# Altium footprint library KNR_Kurs.PcbLib: 250 footprints (part 8 of 16)
Each footprint in its own frame and in the unit in brackets; x right, y up, seen from the top. Pads: shape width x height; smd on the part's side, far side on the other; paste and mask are expansions set on the pad; w line width, h text height; cw(c..) or ccw(c..) is an arc to the next point about the centre after c.
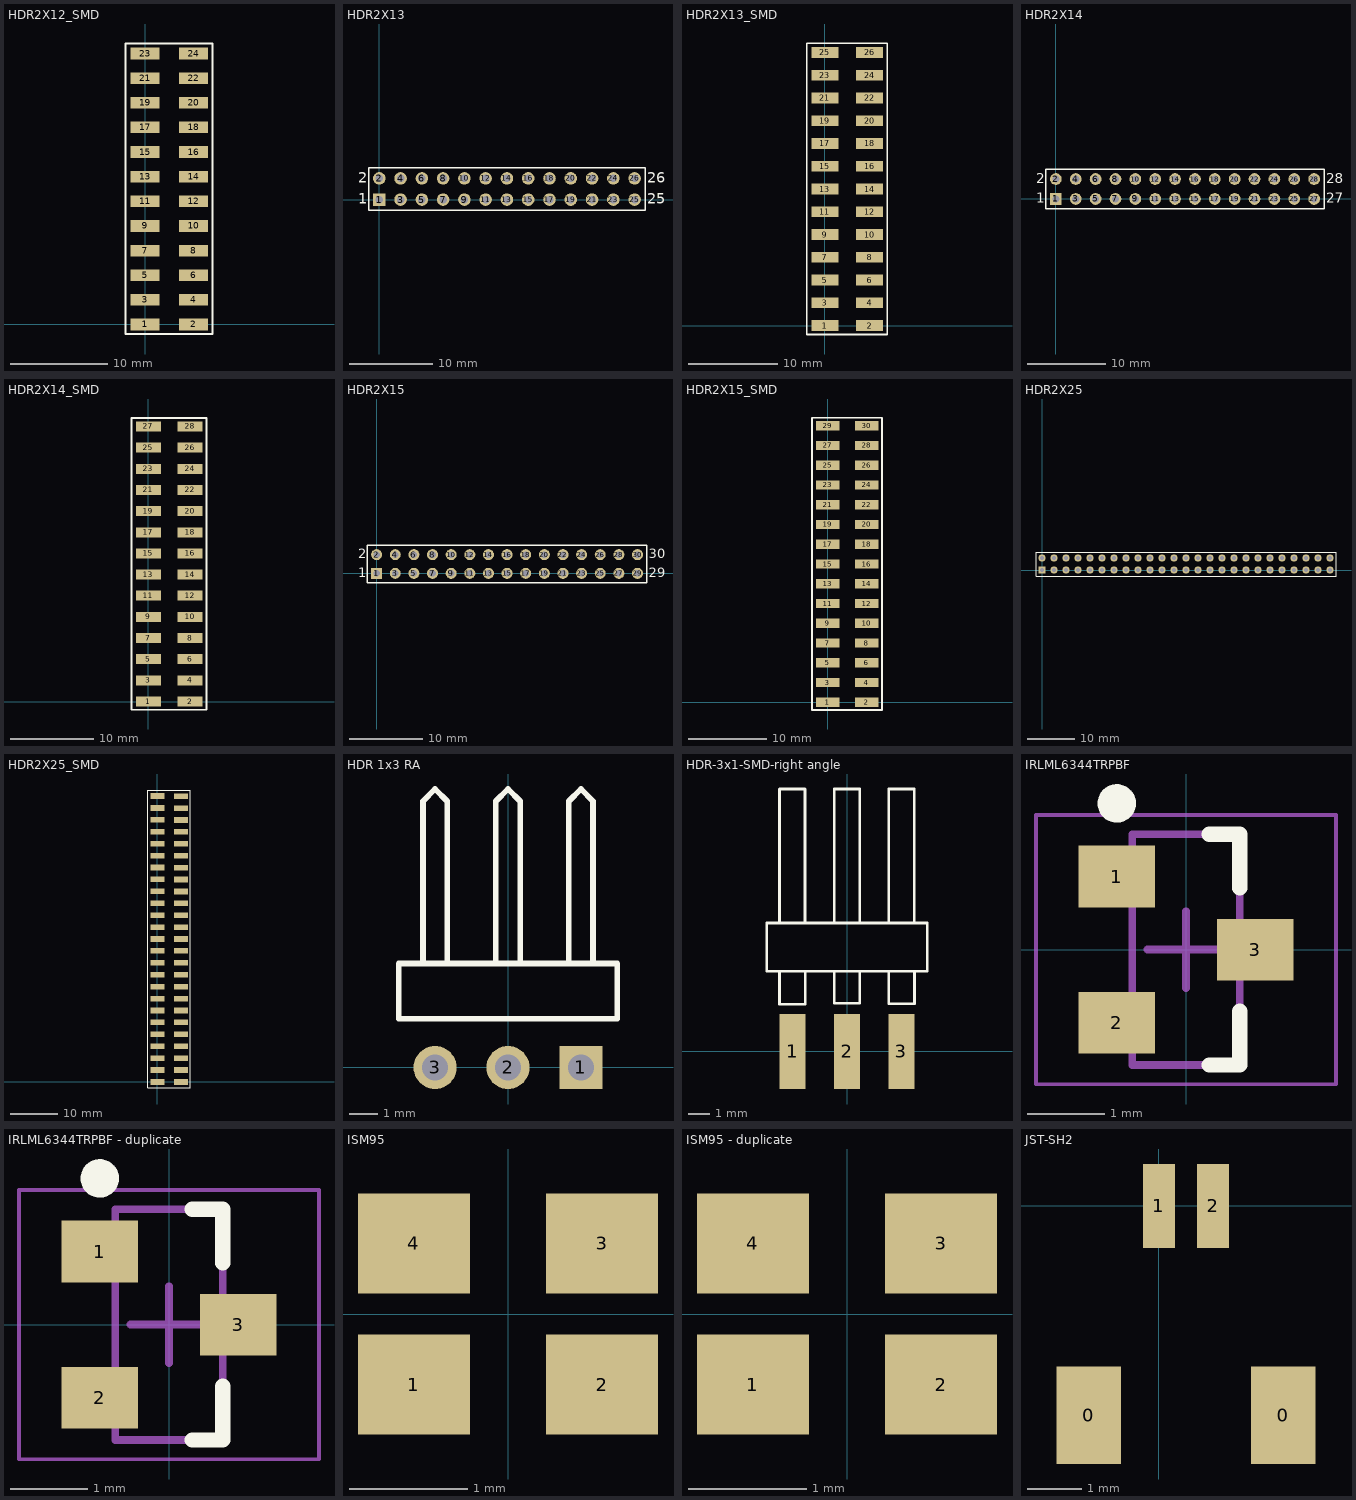
[diagram p7: the footprints below, top view; thin cyan lines are the x and y axes]

## HDR2X12_SMD [mm]
pads (24):
  rect 3x1.2 smd: 1(0,0) 2(5,0) 3(0,2.54) 4(5,2.54) 5(0,5.08) 6(5,5.08) 7(0,7.62) 8(5,7.62) 9(0,10.16) 10(5,10.16) 11(0,12.7) 12(5,12.7) 13(0,15.24) 14(5,15.24) 15(0,17.78) 16(5,17.78) 17(0,20.32) 18(5,20.32) 19(0,22.86) 20(5,22.86) 21(0,25.4) 22(5,25.4) 23(0,27.94) 24(5,27.94)
Top Overlay:
  lines w0.2: -2.032,-0.984 -2.032,28.956 6.968,28.956 6.968,-0.984 -2.032,-0.984
3D body "HDR2X12_SMD.stp": height 9.3, standoff 0, extent -1.15,-1.27 6.15,29.21

## HDR2X13 [mm] "Connector; Header; 13x2 Position"
pads (26):
  rect 1.5x1.5 hole 0.9: 1(0,0)
  round 1.5 hole 0.9: 2(0,2.54) 3(2.54,0) 4(2.54,2.54) 5(5.08,0) 6(5.08,2.54) 7(7.62,0) 8(7.62,2.54) 9(10.16,0) 10(10.16,2.54) 11(12.7,0) 12(12.7,2.54) 13(15.24,0) 14(15.24,2.54) 15(17.78,0) 16(17.78,2.54) 17(20.32,0) 18(20.32,2.54) 19(22.86,0) 20(22.86,2.54) 21(25.4,0) 22(25.4,2.54) 23(27.94,0) 24(27.94,2.54) 25(30.48,0) 26(30.48,2.54)
Top Overlay:
  lines w0.2: -1.27,-1.27 31.75,-1.27 31.75,3.81 -1.27,3.81 -1.27,-1.27
  text "26" at 32.004,2.032 h1.27
  text "25" at 32.004,-0.508 h1.27
  text "1" at -2.54,-0.508 h1.27
  text "2" at -2.54,2.032 h1.27
3D body "HDR2X13.stp": height 8.54, standoff -3, extent -1.27,-1.245 31.75,3.835

## HDR2X13_SMD [mm]
pads (26):
  rect 3x1.2 smd: 1(0,0) 2(5,0) 3(0,2.54) 4(5,2.54) 5(0,5.08) 6(5,5.08) 7(0,7.62) 8(5,7.62) 9(0,10.16) 10(5,10.16) 11(0,12.7) 12(5,12.7) 13(0,15.24) 14(5,15.24) 15(0,17.78) 16(5,17.78) 17(0,20.32) 18(5,20.32) 19(0,22.86) 20(5,22.86) 21(0,25.4) 22(5,25.4) 23(0,27.94) 24(5,27.94) 25(0,30.48) 26(5,30.48)
Top Overlay:
  lines w0.2: -2.032,-0.984 -2.032,31.496 6.968,31.496 6.968,-0.984 -2.032,-0.984
3D body "HDR2X13_SMD.stp": height 9.3, standoff 0, extent -1.15,-1.27 6.15,31.75

## HDR2X14 [mm] "Connector; Header; 14x2 Position"
pads (28):
  rect 1.5x1.5 hole 0.9: 1(0,0)
  round 1.5 hole 0.9: 2(0,2.54) 3(2.54,0) 4(2.54,2.54) 5(5.08,0) 6(5.08,2.54) 7(7.62,0) 8(7.62,2.54) 9(10.16,0) 10(10.16,2.54) 11(12.7,0) 12(12.7,2.54) 13(15.24,0) 14(15.24,2.54) 15(17.78,0) 16(17.78,2.54) 17(20.32,0) 18(20.32,2.54) 19(22.86,0) 20(22.86,2.54) 21(25.4,0) 22(25.4,2.54) 23(27.94,0) 24(27.94,2.54) 25(30.48,0) 26(30.48,2.54) 27(33.02,0) 28(33.02,2.54)
Top Overlay:
  lines w0.2: -1.27,-1.27 34.29,-1.27 34.29,3.81 -1.27,3.81 -1.27,-1.27
  text "28" at 34.544,2.032 h1.27
  text "27" at 34.544,-0.508 h1.27
  text "1" at -2.54,-0.508 h1.27
  text "2" at -2.54,2.032 h1.27
3D body "HDR2X14.stp": height 8.54, standoff -3, extent -1.27,-1.245 34.29,3.835

## HDR2X14_SMD [mm]
pads (28):
  rect 3x1.2 smd: 1(0,0) 2(5,0) 3(0,2.54) 4(5,2.54) 5(0,5.08) 6(5,5.08) 7(0,7.62) 8(5,7.62) 9(0,10.16) 10(5,10.16) 11(0,12.7) 12(5,12.7) 13(0,15.24) 14(5,15.24) 15(0,17.78) 16(5,17.78) 17(0,20.32) 18(5,20.32) 19(0,22.86) 20(5,22.86) 21(0,25.4) 22(5,25.4) 23(0,27.94) 24(5,27.94) 25(0,30.48) 26(5,30.48) 27(0,33.02) 28(5.004,33.02)
Top Overlay:
  lines w0.2: -2.032,-0.984 6.968,-0.984 6.968,34.036 -2.032,34.036 -2.032,-0.984
3D body "HDR2X14_SMD.stp": height 9.3, standoff 0, extent -1.15,-1.27 6.15,34.29

## HDR2X15 [mm] "Connector; Header; 15x2 Position"
pads (30):
  rect 1.5x1.5 hole 0.9: 1(0,0)
  round 1.5 hole 0.9: 2(0,2.54) 3(2.54,0) 4(2.54,2.54) 5(5.08,0) 6(5.08,2.54) 7(7.62,0) 8(7.62,2.54) 9(10.16,0) 10(10.16,2.54) 11(12.7,0) 12(12.7,2.54) 13(15.24,0) 14(15.24,2.54) 15(17.78,0) 16(17.78,2.54) 17(20.32,0) 18(20.32,2.54) 19(22.86,0) 20(22.86,2.54) 21(25.4,0) 22(25.4,2.54) 23(27.94,0) 24(27.94,2.54) 25(30.48,0) 26(30.48,2.54) 27(33.02,0) 28(33.02,2.54) 29(35.56,0) 30(35.56,2.54)
Top Overlay:
  lines w0.2: -1.27,-1.27 -1.27,3.81 36.83,3.81 36.83,-1.27 -1.27,-1.27
  text "30" at 37.084,2.032 h1.27
  text "29" at 37.084,-0.508 h1.27
  text "2" at -2.54,2.032 h1.27
  text "1" at -2.54,-0.508 h1.27
3D body "HDR2X15.stp": height 8.54, standoff -3, extent -1.295,-1.245 36.805,3.835

## HDR2X15_SMD [mm]
pads (30):
  rect 3x1.2 smd: 1(0,0) 2(5,0) 3(0,2.54) 4(5,2.54) 5(0,5.08) 6(5,5.08) 7(0,7.62) 8(5,7.62) 9(0,10.16) 10(5,10.16) 11(0,12.7) 12(5,12.7) 13(0,15.24) 14(5,15.24) 15(0,17.78) 16(5,17.78) 17(0,20.32) 18(5,20.32) 19(0,22.86) 20(5,22.86) 21(0,25.4) 22(5,25.4) 23(0,27.94) 24(5,27.94) 25(0,30.48) 26(5,30.48) 27(0,33.02) 28(5.004,33.02) 29(0,35.56) 30(5.004,35.535)
Top Overlay:
  lines w0.2: -2.032,-0.984 6.968,-0.984 6.968,36.576 -2.032,36.576 -2.032,-0.984
3D body "HDR2X15_SMD.stp": height 9.3, standoff 0, extent -1.15,-1.27 6.15,36.83

## HDR2X25 [mm] "Connector; Header; 25x2 Position"
pads (50):
  rect 1.5x1.5 hole 0.9: 1(0,0)
  round 1.5 hole 0.9: 2(0,2.54) 3(2.54,0) 4(2.54,2.54) 5(5.08,0) 6(5.08,2.54) 7(7.62,0) 8(7.62,2.54) 9(10.16,0) 10(10.16,2.54) 11(12.7,0) 12(12.7,2.54) 13(15.24,0) 14(15.24,2.54) 15(17.78,0) 16(17.78,2.54) 17(20.32,0) 18(20.32,2.54) 19(22.86,0) 20(22.86,2.54) 21(25.4,0) 22(25.4,2.54) 23(27.94,0) 24(27.94,2.54) 25(30.48,0) 26(30.48,2.54) 27(33.02,0) 28(33.02,2.54) 29(35.56,0) 30(35.56,2.54) 31(38.1,0) 32(38.1,2.54) 33(40.64,0) 34(40.64,2.54) 35(43.18,0) 36(43.18,2.54) 37(45.72,0) 38(45.72,2.54) 39(48.26,0) 40(48.26,2.54) 41(50.8,0) 42(50.8,2.54) 43(53.34,0) 44(53.34,2.54) 45(55.88,0) 46(55.88,2.54) 47(58.42,0) 48(58.42,2.54) 49(60.96,0) 50(60.96,2.54)
Top Overlay:
  lines w0.2: -1.27,-1.27 -1.27,3.81 62.23,3.81 62.23,-1.27 -1.27,-1.27
3D body "HDR2X25.stp": height 8.04, standoff -3.46, extent -1.27,-1.27 62.23,3.81

## HDR2X25_SMD [mm]
pads (50):
  rect 3x1.2 smd: 1(0,0) 2(5,0) 3(0,2.54) 4(5,2.54) 5(0,5.08) 6(5,5.08) 7(0,7.62) 8(5,7.62) 9(0,10.16) 10(5,10.16) 11(0,12.7) 12(5,12.7) 13(0,15.24) 14(5,15.24) 15(0,17.78) 16(5,17.78) 17(0,20.32) 18(5,20.32) 19(0,22.86) 20(5,22.86) 21(0,25.4) 22(5,25.4) 23(0,27.94) 24(5,27.94) 25(0,30.48) 26(5,30.48) 27(0,33.02) 28(5.004,33.02) 29(0,35.56) 30(5.004,35.535) 31(0,38.1) 32(5.004,38.075) 33(0,40.64) 34(5.004,40.615) 35(0,43.18) 36(5.004,43.155) 37(0,45.72) 38(5.004,45.695) 39(0,48.26) 40(5.004,48.235) 41(0,50.8) 42(5.004,50.775) 43(0,53.34) 44(5.004,53.315) 45(0,55.88) 46(5.004,55.855) 47(0,58.42) 48(5.004,58.395) 49(0,60.96) 50(5.004,60.935)
Top Overlay:
  lines w0.2: -2.032,-1.27 6.968,-1.27 6.968,62.23 -2.032,62.23 -2.032,-1.27
3D body "HDR2X25_SMD.stp": height 9.3, standoff 0, extent -1.182,-1.27 6.118,62.23

## HDR 1x3 RA [mm] "Connector; Header; 3 Position; Right Angle"
height 0.8
pads (3):
  rect 1.5x1.5 hole 0.9: 1(2.54,0)
  round 1.5 hole 0.9: 2(0,0) 3(-2.54,0)
Top Overlay:
  lines w0.2: -2.963,3.675 -2.963,9.275 ; -2.963,9.277 -2.54,9.7 -2.117,9.277 ; -2.117,3.65 -2.117,9.25 ; -0.423,3.675 -0.423,9.25 ; -0.423,9.277 0,9.7 0.423,9.277 ; 0.423,3.675 0.423,9.275 ; 2.117,3.675 2.117,9.25 ; 2.117,9.277 2.54,9.7 2.963,9.277 ; 2.963,3.65 2.963,9.275 ; -3.81,1.7 3.81,1.7 3.81,3.625 -3.81,3.625 -3.81,1.7
3D body "User Library-Header_Male_RA_Low_3Pin.STEP": height 2.51, standoff -3, extent -3.81,-0.32 3.81,9.81

## HDR-3x1-SMD-right angle [mm]
pads (3):
  rect 1.2x3.5 smd: 1(-2.54,0) 2(0,0) 3(2.54,0)
Top Overlay:
  lines w0.127: -3.15,3.7 -3.15,2.2 -1.95,2.2 -1.95,3.7 ; -3.15,6 -3.15,12.25 -1.96,12.25 -1.96,6 ; -0.6,3.75 -0.6,2.25 0.6,2.25 0.6,3.75 ; -0.6,6 -0.6,12.25 0.59,12.25 0.59,6 ; 1.95,3.725 1.95,2.225 3.15,2.225 3.15,3.725 ; 1.95,6 1.95,12.25 3.14,12.25 3.14,6 ; -3.75,3.75 -3.75,6 3.75,6 3.75,3.75 -3.75,3.75

## IRLML6344TRPBF [mm] "N-MOSFET SOT23 Vds - 30V. Id - 5A. Moc - 1,3W. Rds - 0,029 Ohm (dla Vgs=4,5V)."
height 1.1
pads (3):
  rect 1x0.8 smd: 1(-0.9,0.95) 2(-0.9,-0.95) 3(0.9,0)
Top Overlay:
  circle w0.25: c-0.9,1.9 r0.125
  lines w0.2: 0.3,-1.5 0.7,-1.5 0.7,-0.8 ; 0.3,1.5 0.7,1.5 0.7,0.8
Mechanical 13:
  lines w0.1: -0.7,-1.5 -0.7,1.5 0.7,1.5 0.7,-1.5 -0.7,-1.5
Mechanical 15:
  lines w0.05: -1.95,-1.75 -1.95,1.75 1.95,1.75 1.95,-1.75 -1.95,-1.75
  lines w0.1: -0.5,0 0.5,0 ; 0,-0.5 0,0.5
3D body: height 1.1, standoff 0.1, extent -0.7,-1.5 0.7,1.5

## IRLML6344TRPBF - duplicate [mm] "N-MOSFET SOT23 Vds - 30V. Id - 5A. Moc - 1,3W. Rds - 0,029 Ohm (dla Vgs=4,5V)."
height 1.1
pads (3):
  rect 1x0.8 smd: 1(-0.9,0.95) 2(-0.9,-0.95) 3(0.9,0)
Top Overlay:
  circle w0.25: c-0.9,1.9 r0.125
  lines w0.2: 0.3,-1.5 0.7,-1.5 0.7,-0.8 ; 0.3,1.5 0.7,1.5 0.7,0.8
Mechanical 13:
  lines w0.1: -0.7,-1.5 -0.7,1.5 0.7,1.5 0.7,-1.5 -0.7,-1.5
Mechanical 15:
  lines w0.05: -1.95,-1.75 -1.95,1.75 1.95,1.75 1.95,-1.75 -1.95,-1.75
  lines w0.1: -0.5,0 0.5,0 ; 0,-0.5 0,0.5
3D body: height 1.1, standoff 0.1, extent -0.7,-1.5 0.7,1.5

## ISM95 [mm] "Generator: ceramiczny; 25MHz; SMD; 3,3V; ±50ppm; -40÷85°C"
height 0.8
pads (4):
  rect 0.95x0.85 smd: 1(-0.8,-0.6) 2(0.8,-0.6) 3(0.8,0.6) 4(-0.8,0.6)
3D body "User Library-CTS625.STEP": height 1, standoff 0, extent -1.25,-1 1.25,1

## ISM95 - duplicate [mm] "Generator: ceramiczny; 25MHz; SMD; 3,3V; ±50ppm; -40÷85°C"
height 0.8
pads (4):
  rect 0.95x0.85 smd: 1(-0.8,-0.6) 2(0.8,-0.6) 3(0.8,0.6) 4(-0.8,0.6)
3D body "User Library-CTS625.STEP": height 1, standoff 0, extent -1.25,-1 1.25,1

## JST-SH2 [mm] "2-Pin JST-SH SMD"
pads (4):
  rect 1.2x1.8 smd: 0(-1.3,-3.875) 0(2.3,-3.875)
  rect 0.6x1.55 smd: 1(0,0) 2(1,0)
3D body "User Library-JST_SM02B-SRSS-TB.step": height 3, standoff 0, extent -1.5,-4.693 2.488,0.293